# Altium footprint library PCB_Footprints.PcbLib: 303 footprints (part 2 of 19)
Each footprint in its own frame and in the unit in brackets; x right, y up, seen from the top. Pads: shape width x height; smd on the part's side, far side on the other; paste and mask are expansions set on the pad; w line width, h text height; cw(c..) or ccw(c..) is an arc to the next point about the centre after c.
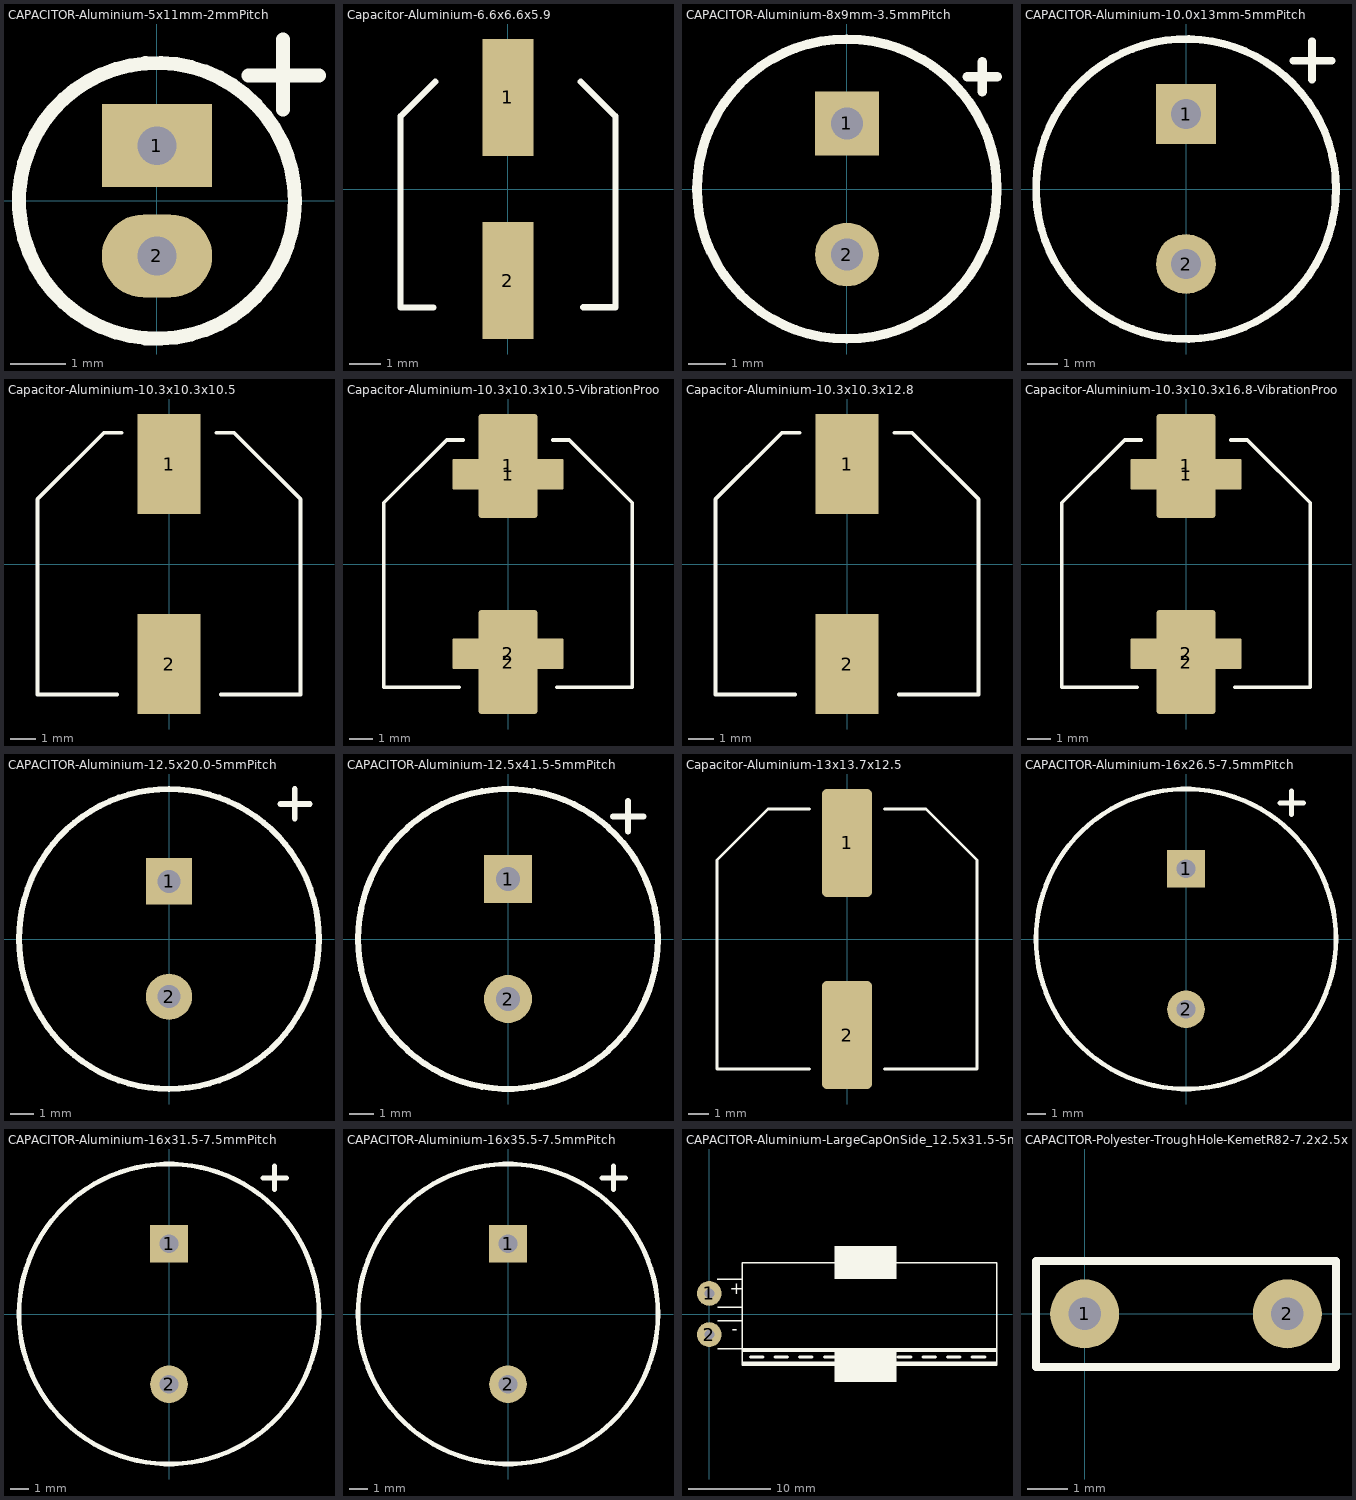
[diagram p1: the footprints below, top view; thin cyan lines are the x and y axes]

## CAPACITOR-Aluminium-5x11mm-2mmPitch [mm] "5mm dia x 11mm height Capacitor"
height 11
pads (2):
  rect 2x1.5 hole 0.7: 1(0,1)
  oval 2x1.5 hole 0.7: 2(0,-1)
Top Overlay:
  circle w0.254: c0,0 r2.5
  lines w0.254: 1.661,2.274 2.936,2.274 ; 2.286,1.651 2.286,2.926
3D body "ESK107M025AC3AA.step": height 12.61, standoff -19.9, extent -2.75,-2.667 2.75,2.833

## Capacitor-Aluminium-6.6x6.6x5.9 [mm] "SMD Aluminium 6.6x6.6x5.9, according to Panasonic Case C6 in AAB8000"
height 6.1
pads (2):
  rect 1.6x3.7 smd: 1(0,2.9) 2(0,-2.9)
Top Overlay:
  lines w0.2: -3.404,-3.746 -3.404,2.3 ; -3.4,2.3 -2.3,3.4 ; -3.388,-3.75 -2.362,-3.75 ; 2.3,3.4 3.4,2.3 ; 2.379,-3.746 3.404,-3.746 3.404,2.3
3D body "PCAP_SVP_C6.step": height 6.05, standoff 0, extent -3.404,-3.746 3.404,3.746

## CAPACITOR-Aluminium-8x9mm-3.5mmPitch [mm] "8mm dia x 9mm height Capacitor from datasheet RUBYCON PZE Series 2020/01"
pads (2):
  rect 1.7x1.7 hole 0.85: 1(0,1.75)
  round 1.7 hole 0.85: 2(0,-1.75)
Top Overlay:
  circle w0.254: c0,0 r4
  lines w0.254: 3.205,2.996 4.003,2.996 ; 3.604,2.597 3.604,3.395
3D body: height 0, standoff -1, extent -0.3,-2.05 0.3,-1.45
3D body: height 0, standoff -1, extent -0.3,1.45 0.3,2.05
3D body: height 9, standoff 0, extent -4,-4 4,4

## CAPACITOR-Aluminium-10.0x13mm-5mmPitch [mm] "10.0mm dia x 13mm height Capacitor"
height 13
pads (2):
  rect 2x2 hole 1: 1(0,2.5)
  round 2 hole 1: 2(0,-2.5)
Top Overlay:
  circle w0.254: c0,0 r5
  lines w0.254: 3.575,4.275 4.85,4.275 ; 4.2,3.65 4.2,4.925
3D body "User Library-Cap-EL(10x13-5).step": height 13, standoff -3.3, extent -5,-5.002 5,5
3D body: height 6.45, standoff 0, extent -0.397,2.101 0.4,2.899
3D body: height 6.45, standoff 0, extent -0.397,-2.899 0.4,-2.101

## Capacitor-Aluminium-10.3x10.3x10.5 [mm] "SMD Aluminium 10.3x10.3, according to Nichicon size10 from CAT.8100E-1"
height 10.5
pads (2):
  rect 2.5x4 smd: 1(0,4) 2(0,-4)
Top Overlay:
  lines w0.15: -2.075,-5.225 -5.255,-5.225 -5.255,2.595 -2.6,5.25 -1.9,5.25 ; 1.9,5.25 2.6,5.25 5.255,2.595 5.255,-5.225 2.075,-5.225
3D body "User Library-cap_10x10x10-1.STEP": height 10.3, standoff -0.2, extent -5.25,-5.899 5.25,5.901

## Capacitor-Aluminium-10.3x10.3x10.5-VibrationProof [mm] "SMD Aluminium 10.3x10.3x10.5 with Vibration Mount, Per CDE Cornell Dubilier, Datasheet HZA_V"
height 10.5
pads (4):
  rrect10% 4.7x1.3 smd: 1(0,3.8) 2(0,-3.8)
  rrect10% 2.5x4.4 smd: 1(0,4.15) 2(0,-4.15)
Top Overlay:
  lines w0.15: -2.075,-5.225 -5.255,-5.225 -5.255,2.595 -2.6,5.25 -1.9,5.25 ; 1.9,5.25 2.6,5.25 5.255,2.595 5.255,-5.225 2.075,-5.225
3D body "User Library-cap_10x10x10-1.STEP": height 10.3, standoff -0.2, extent -5.25,-5.899 5.25,5.901
3D body: height 7.5, standoff 0, extent -5.255,-5.225 -1.275,-1.245
3D body: height 7.5, standoff 0, extent 1.245,-5.255 5.225,-1.275
3D body: height 7.5, standoff 0, extent 1.275,1.245 5.255,5.225
3D body: height 7.5, standoff 0, extent -5.225,1.275 -1.245,5.255

## Capacitor-Aluminium-10.3x10.3x12.8 [mm] "SMD Aluminium 10.3x10.3, according to Nichicon size10 from CAT.8100E-1"
height 12.8
pads (2):
  rect 2.5x4 smd: 1(0,4) 2(0,-4)
Top Overlay:
  lines w0.15: -2.075,-5.225 -5.255,-5.225 -5.255,2.595 -2.6,5.25 -1.9,5.25 ; 1.9,5.25 2.6,5.25 5.255,2.595 5.255,-5.225 2.075,-5.225
3D body "User Library-APXA6R3ARA821MJC0G CAP United Chemi-Con.step": height 11.86, standoff 0.01, extent -5.08,-5.08 5.08,5.08

## Capacitor-Aluminium-10.3x10.3x16.8-VibrationProof [mm] "SMD Aluminium 10.3x10.3x16.8 with Vibration Mount, Per CDE Cornell Dubilier, Datasheet HZA_V. Modified Height to 16.8"
height 16.8
pads (4):
  rrect10% 4.7x1.3 smd: 1(0,3.8) 2(0,-3.8)
  rrect10% 2.5x4.4 smd: 1(0,4.15) 2(0,-4.15)
Top Overlay:
  lines w0.15: -2.075,-5.225 -5.255,-5.225 -5.255,2.595 -2.6,5.25 -1.9,5.25 ; 1.9,5.25 2.6,5.25 5.255,2.595 5.255,-5.225 2.075,-5.225
3D body: height 7.5, standoff 0, extent -5.225,1.275 -1.245,5.255
3D body: height 7.5, standoff 0, extent 1.275,1.245 5.255,5.225
3D body: height 7.5, standoff 0, extent 1.245,-5.255 5.225,-1.275
3D body: height 7.5, standoff 0, extent -5.255,-5.225 -1.275,-1.245
3D body "Cap jé.STEP": height 16.8, standoff -0.2, extent -5.25,-5.899 5.25,5.901

## CAPACITOR-Aluminium-12.5x20.0-5mmPitch [mm] "12.5mm dia x 20mm height Capacitor"
height 20
pads (2):
  rect 2x2 hole 1: 1(0,2.5)
  round 2 hole 1: 2(0,-2.5)
Top Overlay:
  circle w0.254: c0,0 r6.5
  lines w0.254: 4.825,5.85 6.1,5.85 ; 5.45,5.225 5.45,6.5
3D body "User Library-CapAluRadial_D125H200.STEP": height 22, standoff -3, extent -6.5,-6.5 6.5,6.5
3D body: height 6.45, standoff 0, extent -0.397,2.101 0.4,2.899
3D body: height 6.45, standoff 0, extent -0.397,-2.899 0.4,-2.101

## CAPACITOR-Aluminium-12.5x41.5-5mmPitch [mm] "12.5mm dia x 41.5mm height Capacitor"
height 41.5
pads (2):
  rect 2x2 hole 1: 1(0,2.5)
  round 2 hole 1: 2(0,-2.5)
Top Overlay:
  circle w0.254: c-0.001,0 r6.25
  lines w0.254: 4.375,5.1 5.65,5.1 ; 5,4.475 5,5.75
3D body: height 41, standoff 0.05, extent -2.155,-6.3 2.155,0
3D body: height 6.45, standoff 0, extent -0.397,2.101 0.4,2.899
3D body: height 41.5, standoff 0, extent -6.25,-6.25 6.25,6.25

## Capacitor-Aluminium-13x13.7x12.5 [mm] "SMD Aluminium 13.7x13, according to Chemi-con MHSRA-e datasheet"
height 12.5
pads (2):
  rrect20% 2.5x5.4 smd: 1(0,4.8) 2(0,-4.8)
Top Overlay:
  lines w0.15: -1.875,-6.5 -6.5,-6.5 -6.5,3.95 -3.95,6.5 -1.875,6.5 ; 1.874,-6.5 6.499,-6.5 6.499,3.95 3.949,6.5 1.874,6.5
3D body "E-CHIP_D12.5_L13.5__NORMAL_COATED-CASE_STRUCTURE.stp": height -1.6, standoff -15.1, extent -6.5,-6.85 6.5,6.85

## CAPACITOR-Aluminium-16x26.5-7.5mmPitch [mm] "16mm diameter x 26.5mm height Capacitor"
height 26.5
pads (2):
  rect 2x2 hole 1: 1(0,3.75)
  round 2 hole 1: 2(0,-3.75)
Top Overlay:
  circle w0.254: c0,0 r8
  lines w0.254: 5,7.25 6.275,7.25 ; 5.625,6.625 5.625,7.9
3D body "User Library-CAPAER_D160_L265_P075_W008X030.STEP": height 26.51, standoff -3, extent -8,-8.01 8,8

## CAPACITOR-Aluminium-16x31.5-7.5mmPitch [mm] "16mm diameter x 31.5mm height Capacitor"
height 30
pads (2):
  rect 2x2 hole 1: 1(0,3.75)
  round 2 hole 1: 2(0,-3.75)
Top Overlay:
  circle w0.254: c0,0 r8
  lines w0.254: 5,7.25 6.275,7.25 ; 5.625,6.625 5.625,7.9
3D body: height 31.5, standoff 0, extent -7.999,-8 8.001,8
3D body: height 29.9, standoff 0.05, extent -3.175,-8.125 3.172,0

## CAPACITOR-Aluminium-16x35.5-7.5mmPitch [mm] "16mm diameter x 35.5mm height Capacitor"
height 35.5
pads (2):
  rect 2x2 hole 1: 1(0,3.75)
  round 2 hole 1: 2(0,-3.75)
Top Overlay:
  circle w0.254: c0,0 r8
  lines w0.254: 5,7.25 6.275,7.25 ; 5.625,6.625 5.625,7.9
3D body "User Library-Cap electrolitic radial 16x35.STEP": height 35.01, standoff -1.49, extent -7.996,-7.997 7.998,7.997

## CAPACITOR-Aluminium-LargeCapOnSide_12.5x31.5-5mmPitch [mm] "Large 12.5mm dia x 30mm height Capacitor on it's side"
height 12.5
pads (2):
  round 3 hole 1.2: 1(0,2.5) 2(0,-2.5)
Top Overlay:
  rectangle: 15.25,-8.25 22.75,-4.25
  rectangle: 15.25,4.25 22.75,8.25
  region: 35,-5.8 31.22,-5.8 31.22,-6.225 35,-6.225
  rectangle: 4,-4.625 35,-4.2
  region: 31.5,-5.8 4,-5.8 4,-6.225 31.5,-6.225
  lines w0.152: 0.988,4.2 3.988,4.2 ; 1,-4.2 4,-4.2 35,-4.2 ; 1,-0.8 4,-0.8 ; 1,0.8 4,0.8 ; 4,-6.25 4,6.25 35,6.25 35,-6.25 28.7,-6.25 4,-6.25
  lines w0.4: 5,-5.225 6.5,-5.225 ; 8,-5.225 9.5,-5.225 ; 11,-5.225 12.5,-5.225 ; 14,-5.225 15.5,-5.225 ; 17,-5.225 18.5,-5.225 ; 20,-5.225 21.5,-5.225 ; 23,-5.225 24.5,-5.225 ; 26,-5.225 27.5,-5.225 ; 29,-5.225 30.5,-5.225 ; 32,-5.225 33.5,-5.225
  text "-" at 2.7,-3 h2.54
  text "+" at 2.5,1.9 h2.54
3D body: height 12.45, standoff 0, extent 4.25,-6.2 34.25,6.275
3D body: height 6.45, standoff 0, extent -0.397,2.101 0.4,2.899
3D body: height 6.65, standoff 5.85, extent -0.2,2.1 4.2,2.898
3D body: height 6.65, standoff 5.85, extent -0.2,-2.9 4.2,-2.102
3D body: height 6.45, standoff 0, extent -0.397,-2.899 0.4,-2.101

## CAPACITOR-Polyester-TroughHole-KemetR82-7.2x2.5x6.5H-5mmPitch [mm] "from datasheet KEMET R82 Series, Automotive 2020/01"
pads (2):
  round 1.7 hole 0.8: 1(0,0) 2(5,0)
Top Overlay:
  lines w0.2: -1.2,-1.305 -1.2,1.3 6.2,1.3 6.2,-1.305 -1.2,-1.305
3D body "R82EC2100AA50K.step": height 6.61, standoff -5.49, extent -1.2,-1.305 6.2,1.3